# Altium footprint library Miscellaneous THD.PcbLib: 216 footprints (part 13 of 15) (continued)
## WAGO_236-404 [mm] "16A 250VAC 4 Way PCB Terminal Block, Pitch 5mm, CAGE CLAMP® Connection, Wire Size Max: 2.5mm²" (continued)
Mechanical 8:
  lines w0.1: -8.6,-3.756 -7.6,-3.756 ; -8.6,1.244 -7.6,1.244 ; -7.6,-4.756 -7.6,-3.756 ; -7.6,-2.756 -7.6,-3.756 ; -7.6,0.244 -7.6,1.244 ; -7.6,2.244 -7.6,1.244 ; -6.6,-3.756 -7.6,-3.756 ; -6.6,1.244 -7.6,1.244 ; -3.6,-3.756 -2.6,-3.756 ; -3.6,1.244 -2.6,1.244 ; -2.6,-4.756 -2.6,-3.756 ; -2.6,-2.756 -2.6,-3.756 ; -2.6,0.244 -2.6,1.244 ; -2.6,2.244 -2.6,1.244 ; -1.6,-3.756 -2.6,-3.756 ; -1.6,1.244 -2.6,1.244 ; -1,0 1,0 ; 0,-1 0,1 ; 1.4,-3.756 2.4,-3.756 ; 1.4,1.244 2.4,1.244 ; 2.4,-4.756 2.4,-3.756 ; 2.4,-2.756 2.4,-3.756 ; 2.4,0.244 2.4,1.244 ; 2.4,2.244 2.4,1.244 ; 3.4,-3.756 2.4,-3.756 ; 3.4,1.244 2.4,1.244 ; 6.4,-3.756 7.4,-3.756 ; 6.4,1.244 7.4,1.244 ; 7.4,-4.756 7.4,-3.756 ; 7.4,-2.756 7.4,-3.756 ; 7.4,0.244 7.4,1.244 ; 7.4,2.244 7.4,1.244 ; 8.4,-3.756 7.4,-3.756 ; 8.4,1.244 7.4,1.244
Mechanical 14:
  lines w0.1: -10.5,-6.596 -11.1,-6.596 -11.1,-5.396 -10.5,-5.396 ; -10.5,-2.766 -11.1,-2.766 -11.1,-1.166 -10.5,-1.166 ; -10.5,-0.486 10.5,-0.486 ; -10.5,1.504 10.5,1.504 ; -10.5,2.325 -11.1,2.325 -11.1,3.925 -10.5,3.925 ; -10.5,4.649 -11.1,4.649 -11.1,5.844 -10.5,5.844 ; -9.5,-4.193 -9.063,-4.193 ; -8.8,-2.001 -5.2,-2.001 ; -8.8,-1.047 -5.2,-1.047 ; -8.6,-4.193 -8.6,-5.501 ; -7.815,2.701 -7.815,4.893 ccw(c-8.315,4.936) -8.108,5.393 ccw(c-9.052,3.479) -8.815,5.6 ; -7.815,4.54 -6.585,4.54 ; -6.585,2.701 -6.585,4.893 cw(c-6.085,4.936) -6.292,5.393 cw(c-5.348,3.479) -5.585,5.6 ; -6.15,-4.193 -6.15,-5.501 ; -3.8,-2.001 -0.2,-2.001 ; -3.8,-1.047 -0.2,-1.047 ; -3.6,-4.193 -3.6,-5.501 ; -2.815,2.701 -2.815,4.893 ccw(c-3.315,4.936) -3.108,5.393 ccw(c-4.052,3.479) -3.815,5.6 ; -2.815,4.54 -1.585,4.54 ; -1.585,2.701 -1.585,4.893 cw(c-1.085,4.936) -1.292,5.393 cw(c-0.348,3.479) -0.585,5.6 ; -1.15,-4.193 -1.15,-5.501 ; 0.006,-4.193 0.1,-4.299 ; 0.938,-4.193 0.9,-4.299 ; 1.2,-2.001 4.8,-2.001 ; 1.2,-1.047 4.8,-1.047 ; 1.4,-4.193 1.4,-5.501 ; 2.185,2.701 2.185,4.893 ccw(c1.685,4.936) 1.892,5.393 ccw(c0.948,3.479) 1.185,5.6 ; 2.185,4.54 3.415,4.54 ; 3.415,2.701 3.415,4.893 cw(c3.915,4.936) 3.708,5.393 cw(c4.652,3.479) 4.415,5.6 ; 3.85,-4.193 3.85,-5.501 ; 5.006,-4.193 5.1,-4.299 ; 5.938,-4.193 5.9,-4.299 ; 6.2,-2.001 9.8,-2.001 ; 6.2,-1.047 9.8,-1.047 ; 6.4,-4.193 6.4,-5.501 ; 7.185,2.701 7.185,4.893 ccw(c6.685,4.936) 6.892,5.393 ccw(c5.948,3.479) 6.185,5.6 ; 7.185,4.54 8.415,4.54 ; 8.415,2.701 8.415,4.893 cw(c8.915,4.936) 8.708,5.393 cw(c9.652,3.479) 9.415,5.6 ; 8.85,-4.193 8.85,-5.501 ; 10.006,-4.193 10.1,-4.299 ; 10.5,-7.842 -10.5,-7.842 -10.5,6.244 10.5,6.244 10.5,-7.828 ; 10.5,-4.299 10.1,-4.299 ; 10.5,-4.193 -9.063,-4.193 ; 10.5,-3.224 11.2,-3.224 11.2,0.156 10.5,0.156 ; 10.5,-2.107 9.8,-2.107 9.8,-0.552 6.2,-0.552 6.2,-2.107 4.8,-2.107 4.8,-0.552 1.2,-0.552 1.2,-2.107 -0.2,-2.107 -0.2,-0.552 -3.8,-0.552 -3.8,-2.107 -5.2,-2.107 -5.2,-0.552 -8.8,-0.552 -8.8,-2.107 -9.5,-2.107 -9.5,-4.299 -9.1,-4.299 ; -9.1,-7.487 -8.6,-5.501 ; -9.1,-7.487 -4.9,-7.487 ; -9.1,-7.487 -9.1,-4.299 ; -9.1,-4.299 -9.063,-4.193 ; -8.815,5.6 -8.815,2.701 -5.585,2.701 -5.585,5.6 ; -8.815,5.6 -5.585,5.6 ; -8.6,-5.501 -6.15,-5.501 ; -6.15,-5.501 -4.9,-7.487 ; -4.9,-7.487 -4.9,-4.299 ; -4.9,-4.299 -4.1,-4.299 ; -4.9,-4.299 -4.994,-4.193 -4.063,-4.193 -4.1,-4.299 ; -4.1,-7.487 -3.6,-5.501 ; -4.1,-7.487 0.1,-7.487 ; -4.1,-7.487 -4.1,-4.299 ; -3.815,5.6 -3.815,2.701 -0.585,2.701 -0.585,5.6 ; -3.815,5.6 -0.585,5.6 ; -3.6,-5.501 -1.15,-5.501 ; -1.15,-5.501 0.1,-7.487 ; 0.1,-7.487 0.1,-4.299 ; 0.1,-4.299 0.9,-4.299 ; 0.9,-7.487 1.4,-5.501 ; 0.9,-7.487 5.1,-7.487 ; 0.9,-7.487 0.9,-4.299 ; 1.185,5.6 1.185,2.701 4.415,2.701 4.415,5.6 ; 1.185,5.6 4.415,5.6 ; 1.4,-5.501 3.85,-5.501 ; 3.85,-5.501 5.1,-7.487 ; 5.1,-7.487 5.1,-4.299 ; 5.1,-4.299 5.9,-4.299 ; 5.9,-7.487 6.4,-5.501 ; 5.9,-7.487 10.1,-7.487 ; 5.9,-7.487 5.9,-4.299 ; 6.185,5.6 6.185,2.701 9.415,2.701 9.415,5.6 ; 6.185,5.6 9.415,5.6 ; 6.4,-5.501 8.85,-5.501 ; 8.85,-5.501 10.1,-7.487 ; 10.1,-7.487 10.1,-4.299 ; -10.5,0 10.5,0 -10.5,0
3D body "WAGO_236-404.stp": height 12.71, standoff -4, extent -11.1,-7.841 11.2,6.244

## WAGO_236-404/000-009 [mm] "16A 250VAC 4 Way PCB Terminal Block, Pitch 5mm, CAGE CLAMP® Connection, Wire Size Max: 2.5mm²"
height 13
pads (8):
  round 1.8 hole 1.1: 1(-7.6,-3.756) 1(-7.6,1.244) 2(-2.6,-3.756) 2(-2.6,1.244) 3(2.4,-3.756) 3(2.4,1.244) 4(7.4,-3.756) 4(7.4,1.244)
Top Overlay:
  lines w0.2: -10.5,-6.596 -11.1,-6.596 -11.1,-5.396 -10.5,-5.396 ; -10.5,-2.766 -11.1,-2.766 -11.1,-1.166 -10.5,-1.166 ; -10.5,-0.486 10.5,-0.486 ; -10.5,1.504 -8.823,1.504 ; -10.5,2.325 -11.1,2.325 -11.1,3.925 -10.5,3.925 ; -10.5,4.649 -11.1,4.649 -11.1,5.844 -10.5,5.844 ; -9.5,-4.193 -9.063,-4.193 ; -8.8,-2.001 -5.2,-2.001 ; -8.8,-1.047 -5.2,-1.047 ; -8.771,-4.193 -9.063,-4.193 ; -8.6,-4.506 -8.6,-5.501 ; -7.815,2.701 -7.815,4.893 ccw(c-8.315,4.936) -8.108,5.393 ccw(c-9.052,3.479) -8.815,5.6 ; -7.815,4.54 -6.585,4.54 ; -6.585,2.701 -6.585,4.893 cw(c-6.085,4.936) -6.292,5.393 cw(c-5.348,3.479) -5.585,5.6 ; -6.429,-4.193 -3.771,-4.193 ; -6.377,1.504 -3.823,1.504 ; -6.15,-4.193 -6.15,-5.501 ; -3.8,-2.001 -0.2,-2.001 ; -3.8,-1.047 -0.2,-1.047 ; -3.6,-4.506 -3.6,-5.501 ; -2.815,2.701 -2.815,4.893 ccw(c-3.315,4.936) -3.108,5.393 ccw(c-4.052,3.479) -3.815,5.6 ; -2.815,4.54 -1.585,4.54 ; -1.585,2.701 -1.585,4.893 cw(c-1.085,4.936) -1.292,5.393 cw(c-0.348,3.479) -0.585,5.6 ; -1.429,-4.193 1.229,-4.193 ; -1.377,1.504 1.177,1.504 ; -1.15,-4.193 -1.15,-5.501 ; -1,0 1,0 ; 0.006,-4.193 0.1,-4.299 ; 0.938,-4.193 0.9,-4.299 ; 1.2,-2.001 4.8,-2.001 ; 1.2,-1.047 4.8,-1.047 ; 1.4,-4.506 1.4,-5.501 ; 2.185,2.701 2.185,4.893 ccw(c1.685,4.936) 1.892,5.393 ccw(c0.948,3.479) 1.185,5.6 ; 2.185,4.54 3.415,4.54 ; 3.415,2.701 3.415,4.893 cw(c3.915,4.936) 3.708,5.393 cw(c4.652,3.479) 4.415,5.6 ; 3.571,-4.193 6.229,-4.193 ; 3.623,1.504 6.177,1.504 ; 3.85,-4.193 3.85,-5.501 ; 5.006,-4.193 5.1,-4.299 ; 5.938,-4.193 5.9,-4.299 ; 6.2,-2.001 9.8,-2.001 ; 6.2,-1.047 9.8,-1.047 ; 6.4,-4.506 6.4,-5.501 ; 7.185,2.701 7.185,4.893 ccw(c6.685,4.936) 6.892,5.393 ccw(c5.948,3.479) 6.185,5.6 ; 7.185,4.54 8.415,4.54 ; 8.415,2.701 8.415,4.893 cw(c8.915,4.936) 8.708,5.393 cw(c9.652,3.479) 9.415,5.6 ; 8.571,-4.193 10.5,-4.193 ; 8.623,1.504 10.5,1.504 ; 8.85,-4.193 8.85,-5.501 ; 10.006,-4.193 10.1,-4.299 ; 10.5,-7.842 -10.5,-7.842 -10.5,6.244 10.5,6.244 10.5,-7.828 ; 10.5,-4.299 10.1,-4.299 ; 10.5,-3.224 11.2,-3.224 11.2,0.156 10.5,0.156 ; 10.5,-2.107 9.8,-2.107 9.8,-0.552 6.2,-0.552 6.2,-2.107 4.8,-2.107 4.8,-0.552 1.2,-0.552 1.2,-2.107 -0.2,-2.107 -0.2,-0.552 -3.8,-0.552 -3.8,-2.107 -5.2,-2.107 -5.2,-0.552 -8.8,-0.552 -8.8,-2.107 -9.5,-2.107 -9.5,-4.299 -9.1,-4.299 ; -9.1,-7.487 -8.6,-5.501 ; -9.1,-7.487 -4.9,-7.487 ; -9.1,-7.487 -9.1,-4.299 ; -9.1,-4.299 -9.063,-4.193 ; -8.815,5.6 -8.815,2.701 -5.585,2.701 -5.585,5.6 ; -8.815,5.6 -5.585,5.6 ; -8.6,-5.501 -6.15,-5.501 ; -6.15,-5.501 -4.9,-7.487 ; -4.9,-7.487 -4.9,-4.299 ; -4.9,-4.299 -4.1,-4.299 ; -4.9,-4.299 -4.994,-4.193 -4.063,-4.193 -4.1,-4.299 ; -4.1,-7.487 -3.6,-5.501 ; -4.1,-7.487 0.1,-7.487 ; -4.1,-7.487 -4.1,-4.299 ; -3.815,5.6 -3.815,2.701 -0.585,2.701 -0.585,5.6 ; -3.815,5.6 -0.585,5.6 ; -3.6,-5.501 -1.15,-5.501 ; -1.15,-5.501 0.1,-7.487 ; 0.1,-7.487 0.1,-4.299 ; 0.1,-4.299 0.9,-4.299 ; 0.9,-7.487 1.4,-5.501 ; 0.9,-7.487 5.1,-7.487 ; 0.9,-7.487 0.9,-4.299 ; 1.185,5.6 1.185,2.701 4.415,2.701 4.415,5.6 ; 1.185,5.6 4.415,5.6 ; 1.4,-5.501 3.85,-5.501 ; 3.85,-5.501 5.1,-7.487 ; 5.1,-7.487 5.1,-4.299 ; 5.1,-4.299 5.9,-4.299 ; 5.9,-7.487 6.4,-5.501 ; 5.9,-7.487 10.1,-7.487 ; 5.9,-7.487 5.9,-4.299 ; 6.185,5.6 6.185,2.701 9.415,2.701 9.415,5.6 ; 6.185,5.6 9.415,5.6 ; 6.4,-5.501 8.85,-5.501 ; 8.85,-5.501 10.1,-7.487 ; 10.1,-7.487 10.1,-4.299 ; -10.5,0 10.5,0 -10.5,0
Mechanical 8:
  lines w0.1: -8.6,-3.756 -7.6,-3.756 ; -8.6,1.244 -7.6,1.244 ; -7.6,-4.756 -7.6,-3.756 ; -7.6,-2.756 -7.6,-3.756 ; -7.6,0.244 -7.6,1.244 ; -7.6,2.244 -7.6,1.244 ; -6.6,-3.756 -7.6,-3.756 ; -6.6,1.244 -7.6,1.244 ; -3.6,-3.756 -2.6,-3.756 ; -3.6,1.244 -2.6,1.244 ; -2.6,-4.756 -2.6,-3.756 ; -2.6,-2.756 -2.6,-3.756 ; -2.6,0.244 -2.6,1.244 ; -2.6,2.244 -2.6,1.244 ; -1.6,-3.756 -2.6,-3.756 ; -1.6,1.244 -2.6,1.244 ; -1,0 1,0 ; 0,-1 0,1 ; 1.4,-3.756 2.4,-3.756 ; 1.4,1.244 2.4,1.244 ; 2.4,-4.756 2.4,-3.756 ; 2.4,-2.756 2.4,-3.756 ; 2.4,0.244 2.4,1.244 ; 2.4,2.244 2.4,1.244 ; 3.4,-3.756 2.4,-3.756 ; 3.4,1.244 2.4,1.244 ; 6.4,-3.756 7.4,-3.756 ; 6.4,1.244 7.4,1.244 ; 7.4,-4.756 7.4,-3.756 ; 7.4,-2.756 7.4,-3.756 ; 7.4,0.244 7.4,1.244 ; 7.4,2.244 7.4,1.244 ; 8.4,-3.756 7.4,-3.756 ; 8.4,1.244 7.4,1.244
Mechanical 14:
  lines w0.1: -10.5,-6.596 -11.1,-6.596 -11.1,-5.396 -10.5,-5.396 ; -10.5,-2.766 -11.1,-2.766 -11.1,-1.166 -10.5,-1.166 ; -10.5,-0.486 10.5,-0.486 ; -10.5,1.504 10.5,1.504 ; -10.5,2.325 -11.1,2.325 -11.1,3.925 -10.5,3.925 ; -10.5,4.649 -11.1,4.649 -11.1,5.844 -10.5,5.844 ; -9.5,-4.193 -9.063,-4.193 ; -8.8,-2.001 -5.2,-2.001 ; -8.8,-1.047 -5.2,-1.047 ; -8.6,-4.193 -8.6,-5.501 ; -7.815,2.701 -7.815,4.893 ccw(c-8.315,4.936) -8.108,5.393 ccw(c-9.052,3.479) -8.815,5.6 ; -7.815,4.54 -6.585,4.54 ; -6.585,2.701 -6.585,4.893 cw(c-6.085,4.936) -6.292,5.393 cw(c-5.348,3.479) -5.585,5.6 ; -6.15,-4.193 -6.15,-5.501 ; -3.8,-2.001 -0.2,-2.001 ; -3.8,-1.047 -0.2,-1.047 ; -3.6,-4.193 -3.6,-5.501 ; -2.815,2.701 -2.815,4.893 ccw(c-3.315,4.936) -3.108,5.393 ccw(c-4.052,3.479) -3.815,5.6 ; -2.815,4.54 -1.585,4.54 ; -1.585,2.701 -1.585,4.893 cw(c-1.085,4.936) -1.292,5.393 cw(c-0.348,3.479) -0.585,5.6 ; -1.15,-4.193 -1.15,-5.501 ; 0.006,-4.193 0.1,-4.299 ; 0.938,-4.193 0.9,-4.299 ; 1.2,-2.001 4.8,-2.001 ; 1.2,-1.047 4.8,-1.047 ; 1.4,-4.193 1.4,-5.501 ; 2.185,2.701 2.185,4.893 ccw(c1.685,4.936) 1.892,5.393 ccw(c0.948,3.479) 1.185,5.6 ; 2.185,4.54 3.415,4.54 ; 3.415,2.701 3.415,4.893 cw(c3.915,4.936) 3.708,5.393 cw(c4.652,3.479) 4.415,5.6 ; 3.85,-4.193 3.85,-5.501 ; 5.006,-4.193 5.1,-4.299 ; 5.938,-4.193 5.9,-4.299 ; 6.2,-2.001 9.8,-2.001 ; 6.2,-1.047 9.8,-1.047 ; 6.4,-4.193 6.4,-5.501 ; 7.185,2.701 7.185,4.893 ccw(c6.685,4.936) 6.892,5.393 ccw(c5.948,3.479) 6.185,5.6 ; 7.185,4.54 8.415,4.54 ; 8.415,2.701 8.415,4.893 cw(c8.915,4.936) 8.708,5.393 cw(c9.652,3.479) 9.415,5.6 ; 8.85,-4.193 8.85,-5.501 ; 10.006,-4.193 10.1,-4.299 ; 10.5,-7.842 -10.5,-7.842 -10.5,6.244 10.5,6.244 10.5,-7.828 ; 10.5,-4.299 10.1,-4.299 ; 10.5,-4.193 -9.063,-4.193 ; 10.5,-3.224 11.2,-3.224 11.2,0.156 10.5,0.156 ; 10.5,-2.107 9.8,-2.107 9.8,-0.552 6.2,-0.552 6.2,-2.107 4.8,-2.107 4.8,-0.552 1.2,-0.552 1.2,-2.107 -0.2,-2.107 -0.2,-0.552 -3.8,-0.552 -3.8,-2.107 -5.2,-2.107 -5.2,-0.552 -8.8,-0.552 -8.8,-2.107 -9.5,-2.107 -9.5,-4.299 -9.1,-4.299 ; -9.1,-7.487 -8.6,-5.501 ; -9.1,-7.487 -4.9,-7.487 ; -9.1,-7.487 -9.1,-4.299 ; -9.1,-4.299 -9.063,-4.193 ; -8.815,5.6 -8.815,2.701 -5.585,2.701 -5.585,5.6 ; -8.815,5.6 -5.585,5.6 ; -8.6,-5.501 -6.15,-5.501 ; -6.15,-5.501 -4.9,-7.487 ; -4.9,-7.487 -4.9,-4.299 ; -4.9,-4.299 -4.1,-4.299 ; -4.9,-4.299 -4.994,-4.193 -4.063,-4.193 -4.1,-4.299 ; -4.1,-7.487 -3.6,-5.501 ; -4.1,-7.487 0.1,-7.487 ; -4.1,-7.487 -4.1,-4.299 ; -3.815,5.6 -3.815,2.701 -0.585,2.701 -0.585,5.6 ; -3.815,5.6 -0.585,5.6 ; -3.6,-5.501 -1.15,-5.501 ; -1.15,-5.501 0.1,-7.487 ; 0.1,-7.487 0.1,-4.299 ; 0.1,-4.299 0.9,-4.299 ; 0.9,-7.487 1.4,-5.501 ; 0.9,-7.487 5.1,-7.487 ; 0.9,-7.487 0.9,-4.299 ; 1.185,5.6 1.185,2.701 4.415,2.701 4.415,5.6 ; 1.185,5.6 4.415,5.6 ; 1.4,-5.501 3.85,-5.501 ; 3.85,-5.501 5.1,-7.487 ; 5.1,-7.487 5.1,-4.299 ; 5.1,-4.299 5.9,-4.299 ; 5.9,-7.487 6.4,-5.501 ; 5.9,-7.487 10.1,-7.487 ; 5.9,-7.487 5.9,-4.299 ; 6.185,5.6 6.185,2.701 9.415,2.701 9.415,5.6 ; 6.185,5.6 9.415,5.6 ; 6.4,-5.501 8.85,-5.501 ; 8.85,-5.501 10.1,-7.487 ; 10.1,-7.487 10.1,-4.299 ; -10.5,0 10.5,0 -10.5,0
3D body "WAGO_236-404-009.stp": height 12.71, standoff -4, extent -11.1,-7.841 11.2,6.244

## WAGO_236-406 [mm] "24A 320VAC 6 Way PCB Terminal Block, Pitch 5mm, CAGE CLAMP® Connection, Wire Size Max: 2.5mm²"
height 13
pads (12):
  round 1.8 hole 1.1: 1(-12.6,-3.756) 1(-12.6,1.244) 2(-7.6,-3.756) 2(-7.6,1.244) 3(-2.6,-3.756) 3(-2.6,1.244) 4(2.4,-3.756) 4(2.4,1.244) 5(7.4,-3.756) 5(7.4,1.244) 6(12.4,-3.756) 6(12.4,1.244)
Top Overlay:
  drawing of 223 lines, arcs and shapes, not listed
Mechanical 8:
  circle w0.05: c-12.6,1.244 r0.9
  circle w0.05: c-12.6,1.244 r0.55
  circle w0.05: c-7.6,1.244 r0.9
  circle w0.05: c-7.6,1.244 r0.55
  circle w0.05: c-2.6,1.244 r0.9
  circle w0.05: c-2.6,1.244 r0.55
  circle w0.05: c2.4,1.244 r0.9
  circle w0.05: c2.4,1.244 r0.55
  circle w0.05: c12.4,1.244 r0.9
  circle w0.05: c12.4,1.244 r0.55
  circle w0.05: c12.4,-3.756 r0.9
  circle w0.05: c12.4,-3.756 r0.55
  circle w0.05: c2.4,-3.756 r0.9
  circle w0.05: c2.4,-3.756 r0.55
  circle w0.05: c-2.6,-3.756 r0.9
  circle w0.05: c-2.6,-3.756 r0.55
  circle w0.05: c-12.6,-3.756 r0.9
  circle w0.05: c-12.6,-3.756 r0.55
  circle w0.05: c-7.6,-3.756 r0.9
  circle w0.05: c-7.6,-3.756 r0.55
  circle w0.05: c7.4,1.244 r0.9
  circle w0.05: c7.4,1.244 r0.55
  circle w0.05: c7.4,-3.756 r0.9
  circle w0.05: c7.4,-3.756 r0.55
  lines w0.05: -13.6,-3.756 -12.6,-3.756 ; -13.6,1.244 -12.6,1.244 ; -12.6,-4.756 -12.6,-3.756 ; -12.6,-2.756 -12.6,-3.756 ; -12.6,0.244 -12.6,1.244 ; -12.6,2.244 -12.6,1.244 ; -11.6,-3.756 -12.6,-3.756 ; -11.6,1.244 -12.6,1.244 ; -8.6,-3.756 -7.6,-3.756 ; -8.6,1.244 -7.6,1.244 ; -7.6,-4.756 -7.6,-3.756 ; -7.6,-2.756 -7.6,-3.756 ; -7.6,0.244 -7.6,1.244 ; -7.6,2.244 -7.6,1.244 ; -6.6,-3.756 -7.6,-3.756 ; -6.6,1.244 -7.6,1.244 ; -3.6,-3.756 -2.6,-3.756 ; -3.6,1.244 -2.6,1.244 ; -2.6,-4.756 -2.6,-3.756 ; -2.6,-2.756 -2.6,-3.756 ; -2.6,0.244 -2.6,1.244 ; -2.6,2.244 -2.6,1.244 ; -1.6,-3.756 -2.6,-3.756 ; -1.6,1.244 -2.6,1.244 ; -1,0 1,0 ; 0,-1 0,1 ; 1.4,-3.756 2.4,-3.756 ; 1.4,1.244 2.4,1.244 ; 2.4,-4.756 2.4,-3.756 ; 2.4,-2.756 2.4,-3.756 ; 2.4,0.244 2.4,1.244 ; 2.4,2.244 2.4,1.244 ; 3.4,-3.756 2.4,-3.756 ; 3.4,1.244 2.4,1.244 ; 6.4,-3.756 7.4,-3.756 ; 6.4,1.244 7.4,1.244 ; 7.4,-4.756 7.4,-3.756 ; 7.4,-2.756 7.4,-3.756 ; 7.4,0.244 7.4,1.244 ; 7.4,2.244 7.4,1.244 ; 8.4,-3.756 7.4,-3.756 ; 8.4,1.244 7.4,1.244 ; 11.4,-3.756 12.4,-3.756 ; 11.4,1.244 12.4,1.244 ; 12.4,-4.756 12.4,-3.756 ; 12.4,-2.756 12.4,-3.756 ; 12.4,0.244 12.4,1.244 ; 12.4,2.244 12.4,1.244 ; 13.4,-3.756 12.4,-3.756 ; 13.4,1.244 12.4,1.244
Mechanical 14:
  drawing of 198 lines, arcs and shapes, not listed
3D body "WAGO_236-406.stp": height 12.71, standoff -4, extent -16.1,-7.841 16.2,6.244

## WAGO_236-412 [mm] "24A 320VAC 12 Way PCB Terminal Block, Pitch 5mm, CAGE CLAMP® Connection, Wire Size Max: 2.5mm²"
height 13
pads (24):
  round 1.8 hole 1.1: 1(-27.6,-3.756) 1(-27.6,1.244) 2(-22.6,-3.756) 2(-22.6,1.244) 3(-17.6,-3.756) 3(-17.6,1.244) 4(-12.6,-3.756) 4(-12.6,1.244) 5(-7.6,-3.756) 5(-7.6,1.244) 6(-2.6,-3.756) 6(-2.6,1.244) 7(2.4,-3.756) 7(2.4,1.244) 8(7.4,-3.756) 8(7.4,1.244) 9(12.4,-3.756) 9(12.4,1.244) 10(17.4,-3.756) 10(17.4,1.244) 11(22.4,-3.756) 11(22.4,1.244) 12(27.4,-3.756) 12(27.4,1.244)
Top Overlay:
  drawing of 412 lines, arcs and shapes, not listed
Mechanical 8:
  circle w0.1: c22.4,-3.756 r0.55
  circle w0.1: c22.4,-3.756 r0.9
  circle w0.1: c22.4,1.244 r0.55
  circle w0.1: c22.4,1.244 r0.9
  circle w0.1: c17.4,-3.756 r0.55
  circle w0.1: c17.4,-3.756 r0.9
  circle w0.1: c17.4,1.244 r0.55
  circle w0.1: c17.4,1.244 r0.9
  circle w0.1: c12.4,-3.756 r0.55
  circle w0.1: c12.4,-3.756 r0.9
  circle w0.1: c12.4,1.244 r0.55
  circle w0.1: c12.4,1.244 r0.9
  circle w0.1: c-22.6,-3.756 r0.55
  circle w0.1: c-22.6,-3.756 r0.9
  circle w0.1: c-22.6,1.244 r0.55
  circle w0.1: c-22.6,1.244 r0.9
  circle w0.1: c-17.6,-3.756 r0.55
  circle w0.1: c-17.6,-3.756 r0.9
  circle w0.1: c-17.6,1.244 r0.55
  circle w0.1: c-17.6,1.244 r0.9
  circle w0.1: c-12.6,-3.756 r0.55
  circle w0.1: c-12.6,-3.756 r0.9
  circle w0.1: c-12.6,1.244 r0.55
  circle w0.1: c-12.6,1.244 r0.9
  circle w0.1: c7.4,-3.756 r0.55
  circle w0.1: c7.4,-3.756 r0.9
  circle w0.1: c7.4,1.244 r0.55
  circle w0.1: c7.4,1.244 r0.9
  circle w0.1: c-7.6,-3.756 r0.55
  circle w0.1: c-7.6,-3.756 r0.9
  circle w0.1: c-27.6,-3.756 r0.55
  circle w0.1: c-27.6,-3.756 r0.9
  circle w0.1: c-2.6,-3.756 r0.55
  circle w0.1: c-2.6,-3.756 r0.9
  circle w0.1: c2.4,-3.756 r0.55
  circle w0.1: c2.4,-3.756 r0.9
  circle w0.1: c27.4,-3.756 r0.55
  circle w0.1: c27.4,-3.756 r0.9
  circle w0.1: c27.4,1.244 r0.55
  circle w0.1: c27.4,1.244 r0.9
  circle w0.1: c2.4,1.244 r0.55
  circle w0.1: c2.4,1.244 r0.9
  circle w0.1: c-2.6,1.244 r0.55
  circle w0.1: c-2.6,1.244 r0.9
  circle w0.1: c-7.6,1.244 r0.55
  circle w0.1: c-7.6,1.244 r0.9
  circle w0.1: c-27.6,1.244 r0.55
  circle w0.1: c-27.6,1.244 r0.9
  lines w0.1: -28.6,-3.756 -27.6,-3.756 ; -28.6,1.244 -27.6,1.244 ; -27.6,-4.756 -27.6,-3.756 ; -27.6,-2.756 -27.6,-3.756 ; -27.6,0.244 -27.6,1.244 ; -27.6,2.244 -27.6,1.244 ; -26.6,-3.756 -27.6,-3.756 ; -26.6,1.244 -27.6,1.244 ; -23.6,-3.756 -22.6,-3.756 ; -23.6,1.244 -22.6,1.244 ; -22.6,-4.756 -22.6,-3.756 ; -22.6,-2.756 -22.6,-3.756 ; -22.6,0.244 -22.6,1.244 ; -22.6,2.244 -22.6,1.244 ; -21.6,-3.756 -22.6,-3.756 ; -21.6,1.244 -22.6,1.244 ; -18.6,-3.756 -17.6,-3.756 ; -18.6,1.244 -17.6,1.244 ; -17.6,-4.756 -17.6,-3.756 ; -17.6,-2.756 -17.6,-3.756 ; -17.6,0.244 -17.6,1.244 ; -17.6,2.244 -17.6,1.244 ; -16.6,-3.756 -17.6,-3.756 ; -16.6,1.244 -17.6,1.244 ; -13.6,-3.756 -12.6,-3.756 ; -13.6,1.244 -12.6,1.244 ; -12.6,-4.756 -12.6,-3.756 ; -12.6,-2.756 -12.6,-3.756 ; -12.6,0.244 -12.6,1.244 ; -12.6,2.244 -12.6,1.244 ; -11.6,-3.756 -12.6,-3.756 ; -11.6,1.244 -12.6,1.244 ; -8.6,-3.756 -7.6,-3.756 ; -8.6,1.244 -7.6,1.244 ; -7.6,-4.756 -7.6,-3.756 ; -7.6,-2.756 -7.6,-3.756 ; -7.6,0.244 -7.6,1.244 ; -7.6,2.244 -7.6,1.244 ; -6.6,-3.756 -7.6,-3.756 ; -6.6,1.244 -7.6,1.244 ; -3.6,-3.756 -2.6,-3.756 ; -3.6,1.244 -2.6,1.244 ; -2.6,-4.756 -2.6,-3.756 ; -2.6,-2.756 -2.6,-3.756 ; -2.6,0.244 -2.6,1.244 ; -2.6,2.244 -2.6,1.244 ; -1.6,-3.756 -2.6,-3.756 ; -1.6,1.244 -2.6,1.244 ; -1,0 1,0 ; 0,-1 0,1 ; 1.4,-3.756 2.4,-3.756 ; 1.4,1.244 2.4,1.244 ; 2.4,-4.756 2.4,-3.756 ; 2.4,-2.756 2.4,-3.756 ; 2.4,0.244 2.4,1.244 ; 2.4,2.244 2.4,1.244 ; 3.4,-3.756 2.4,-3.756 ; 3.4,1.244 2.4,1.244 ; 6.4,-3.756 7.4,-3.756 ; 6.4,1.244 7.4,1.244 ; 7.4,-4.756 7.4,-3.756 ; 7.4,-2.756 7.4,-3.756 ; 7.4,0.244 7.4,1.244 ; 7.4,2.244 7.4,1.244 ; 8.4,-3.756 7.4,-3.756 ; 8.4,1.244 7.4,1.244 ; 11.4,-3.756 12.4,-3.756 ; 11.4,1.244 12.4,1.244 ; 12.4,-4.756 12.4,-3.756 ; 12.4,-2.756 12.4,-3.756 ; 12.4,0.244 12.4,1.244 ; 12.4,2.244 12.4,1.244 ; 13.4,-3.756 12.4,-3.756 ; 13.4,1.244 12.4,1.244 ; 16.4,-3.756 17.4,-3.756 ; 16.4,1.244 17.4,1.244 ; 17.4,-4.756 17.4,-3.756 ; 17.4,-2.756 17.4,-3.756 ; 17.4,0.244 17.4,1.244 ; 17.4,2.244 17.4,1.244 ; 18.4,-3.756 17.4,-3.756 ; 18.4,1.244 17.4,1.244 ; 21.4,-3.756 22.4,-3.756 ; 21.4,1.244 22.4,1.244 ; 22.4,-4.756 22.4,-3.756 ; 22.4,-2.756 22.4,-3.756 ; 22.4,0.244 22.4,1.244 ; 22.4,2.244 22.4,1.244 ; 23.4,-3.756 22.4,-3.756 ; 23.4,1.244 22.4,1.244 ; 26.4,-3.756 27.4,-3.756 ; 26.4,1.244 27.4,1.244 ; 27.4,-4.756 27.4,-3.756 ; 27.4,-2.756 27.4,-3.756 ; 27.4,0.244 27.4,1.244 ; 27.4,2.244 27.4,1.244 ; 28.4,-3.756 27.4,-3.756 ; 28.4,1.244 27.4,1.244
Mechanical 14:
  drawing of 369 lines, arcs and shapes, not listed
3D body "WAGO_236-412.stp": height 12.71, standoff -4, extent -31.1,-7.841 31.2,6.244

## WAGO_256-403 [mm] "24A 320VAC Modular PCB terminal block 2 solder pins / pole pin Pitch 5mm, CAGE CLAMP® Connection"
height 18.2
pads (6):
  round 1.9 hole 1.2: 1(-5,-2.5) 1(-5,2.5) 2(0,-2.5) 2(0,2.5) 3(5,-2.5) 3(5,2.5)
Top Overlay:
  lines w0.2: -7.85,0.09 -7.85,0.35 -7.15,0.35 ; -7.5,4.135 -8.75,4.135 -8.75,5.335 -7.5,5.335 ; -7.5,5.832 -8.75,5.832 -8.75,7.032 -7.15,7.032 ; -7.15,-7.332 -2.15,-7.332 2.85,-7.332 7.85,-7.332 ; -7.15,-5.341 -8.75,-5.341 -8.75,-4.141 -7.15,-4.141 ; -7.15,-1.947 -6.232,-1.947 ; -7.15,-1.51 -8.75,-1.51 -8.75,0.09 -7.15,0.09 ; -7.15,0.138 -2.15,0.138 2.85,0.138 7.85,0.138 ; -7.15,0.547 -2.15,0.547 2.85,0.547 7.85,0.547 ; -7.15,1.187 -5.387,1.187 ; -7.15,3.448 -7.15,-7.522 -2.15,-7.522 ; -7.15,6.349 -7.15,7.5 -2.15,7.5 ; -6.315,-3.68 -6.8,-3.68 -6.8,-6.826 ; -6.144,-3.217 -6.3,-3.599 -6.3,-4.811 ; -5.615,3.702 -6.9,3.702 -6.9,3.448 -7.5,3.448 -7.5,6.349 -5.85,6.349 -5.85,6.669 -4.25,6.669 -4.25,6.349 -2.6,6.349 -2.6,3.448 -3.2,3.448 -3.2,3.702 -4.385,3.702 ; -4.613,1.187 -2.15,1.187 -0.387,1.187 ; -3.95,-3.248 -3.95,-4.811 ; -3.924,-3.316 -3.785,-3.68 -2.55,-3.68 -2.55,-6.826 ; -3.768,-1.947 -2.15,-1.947 -1.232,-1.947 ; -2.15,3.448 -2.15,-7.522 ; -2.15,6.349 -2.15,7.5 ; -1.315,-3.68 -1.8,-3.68 -1.8,-6.826 ; -1.144,-3.217 -1.3,-3.599 -1.3,-4.811 ; -0.615,3.702 -1.9,3.702 -1.9,3.448 -2.5,3.448 -2.5,6.349 -0.85,6.349 -0.85,6.669 0.75,6.669 0.75,6.349 2.4,6.349 2.4,3.448 1.8,3.448 1.8,3.702 0.615,3.702 ; 0.387,1.187 2.85,1.187 4.613,1.187 ; 1.05,-3.248 1.05,-4.811 ; 1.076,-3.316 1.215,-3.68 2.45,-3.68 2.45,-6.826 ; 1.232,-1.947 2.85,-1.947 3.768,-1.947 ; 2.85,3.448 2.85,-7.522 ; 2.85,6.349 2.85,7.5 ; 3.685,-3.68 3.2,-3.68 3.2,-6.826 ; 3.856,-3.217 3.7,-3.599 3.7,-4.811 ; 4.385,3.702 3.1,3.702 3.1,3.448 2.5,3.448 2.5,6.349 4.15,6.349 4.15,6.669 5.75,6.669 5.75,6.349 7.4,6.349 7.4,3.448 6.8,3.448 6.8,3.702 5.615,3.702 ; 5.387,1.187 7.85,1.187 ; 6.05,-3.248 6.05,-4.811 ; 6.076,-3.316 6.215,-3.68 7.45,-3.68 7.45,-6.826 ; 6.232,-1.947 7.85,-1.947 ; 7.85,-1.304 7.85,-2.31 ; 7.85,-0.356 9.15,-0.356 ; 7.85,1.553 9.15,1.553 ; 7.85,2.091 7.85,-2.31 ; 8.55,-0.356 8.55,-2.31 ; -6.8,-6.826 -6.3,-4.811 ; -6.8,-6.826 -2.55,-6.826 ; -6.3,-4.811 -3.95,-4.811 ; -3.95,-4.811 -2.55,-6.826 ; -2.15,-7.522 2.85,-7.522 ; -2.15,7.5 2.85,7.5 ; -1.8,-6.826 -1.3,-4.811 ; -1.8,-6.826 2.45,-6.826 ; -1.3,-4.811 1.05,-4.811 ; 1.05,-4.811 2.45,-6.826 ; 2.85,-7.522 7.85,-7.522 7.85,-2.31 ; 2.85,7.5 7.85,7.5 7.85,6.078 9.15,6.078 ; 3.2,-6.826 3.7,-4.811 ; 3.2,-6.826 7.45,-6.826 ; 3.7,-4.811 6.05,-4.811 ; 6.05,-4.811 7.45,-6.826 ; 7.85,-2.31 8.55,-2.31 ; 7.85,-2.31 8.55,-2.31 ; 9.15,-0.356 9.15,6.078 ; 9.15,-0.356 9.15,6.078
Mechanical 8:
  lines w0.05: -5.5,-2.5 -5,-2.5 ; -5.5,2.5 -5,2.5 ; -5,-3 -5,-2.5 ; -5,-2 -5,-2.5 ; -5,2 -5,2.5 ; -5,3 -5,2.5 ; -4.5,-2.5 -5,-2.5 ; -4.5,2.5 -5,2.5 ; -0.5,-2.5 0,-2.5 ; -0.5,0 0,0 ; -0.5,2.5 0,2.5 ; 0,-3 0,-2.5 ; 0,-2 0,-2.5 ; 0,-0.5 0,0 ; 0,0.5 0,0 ; 0,2 0,2.5 ; 0,3 0,2.5 ; 0.5,-2.5 0,-2.5 ; 0.5,0 0,0 ; 0.5,2.5 0,2.5 ; 4.5,-2.5 5,-2.5 ; 4.5,2.5 5,2.5 ; 5,-3 5,-2.5 ; 5,-2 5,-2.5 ; 5,2 5,2.5 ; 5,3 5,2.5 ; 5.5,-2.5 5,-2.5 ; 5.5,2.5 5,2.5
Mechanical 14:
  drawing of 178 lines, arcs and shapes, not listed
3D body "WAGO_256-403.stp": height 18.81, standoff -4, extent -8.75,-7.525 9.15,7.5